# Altium footprint library PartsDatabaseV16.1.PcbLib: 145 footprints (part 1 of 10)
Each footprint in its own frame and in the unit in brackets; x right, y up, seen from the top. Pads: shape width x height; smd on the part's side, far side on the other; paste and mask are expansions set on the pad; w line width, h text height; cw(c..) or ccw(c..) is an arc to the next point about the centre after c.
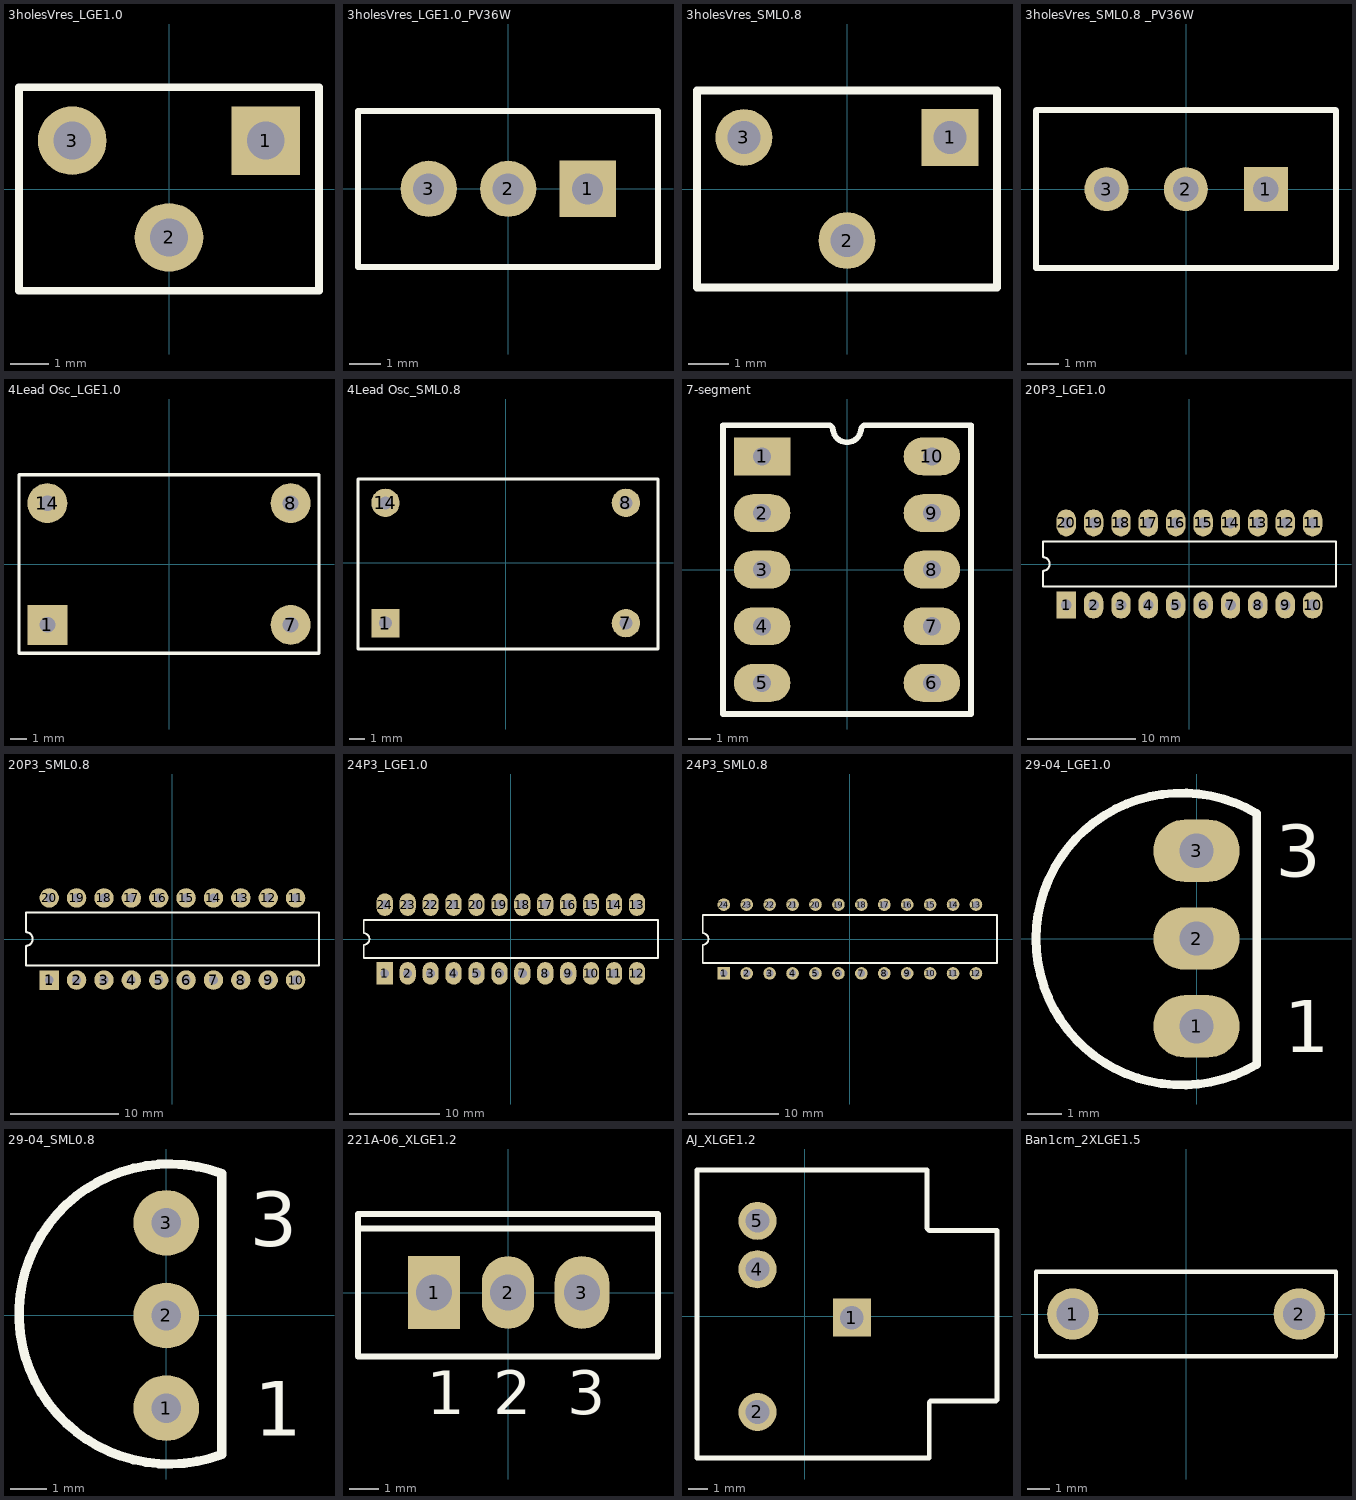
[diagram p0: the footprints below, top view; thin cyan lines are the x and y axes]

## 3holesVres_LGE1.0 [mm] "Variable Resistor, Thru-Hole; 3 Leads"
pads (3):
  rect 1.8x1.8 hole 0.991: 1(2.54,1.27)
  round 1.8 hole 0.991: 2(0,-1.27) 3(-2.54,1.27)
Top Overlay:
  lines w0.2: -3.937,-2.667 -3.937,2.667 3.937,2.667 3.937,-2.667 -3.937,-2.667

## 3holesVres_LGE1.0_PV36W [mm] "Variable Resistor, Thru-Hole; 3 Leads"
pads (3):
  rect 1.8x1.8 hole 0.991: 1(2.54,0)
  round 1.8 hole 0.991: 2(0,0) 3(-2.54,0)
Top Overlay:
  lines w0.2: -4.801,-2.502 -4.801,2.476 ; -4.763,-2.502 4.763,-2.502 ; -4.763,2.489 4.763,2.489 ; 4.788,-2.489 4.788,2.489
3D body "P-trim.step": height 11.3, standoff -1.5, extent -4.801,-2.538 4.799,2.462

## 3holesVres_SML0.8 [mm] "Variable Resistor, Thru-Hole; 3 Leads"
pads (3):
  rect 1.4x1.4 hole 0.813: 1(2.54,1.27)
  round 1.4 hole 0.813: 2(0,-1.27) 3(-2.54,1.27)
Top Overlay:
  lines w0.2: -3.696,-2.426 3.696,-2.426 3.696,2.426 -3.696,2.426 -3.696,-2.426

## 3holesVres_SML0.8 _PV36W [mm] "Variable Resistor, Thru-Hole; 3 Leads"
pads (3):
  rect 1.4x1.4 hole 0.813: 1(2.54,0)
  round 1.4 hole 0.813: 2(-0.013,0) 3(-2.54,0)
Top Overlay:
  lines w0.2: 4.775,-2.515 -4.775,-2.515 -4.788,-2.502 -4.788,2.502 -4.763,2.527 4.75,2.527 4.775,2.502 4.775,-2.489
3D body "P-trim.step": height 11.3, standoff -1.5, extent -4.825,-2.449 4.775,2.551

## 4Lead Osc_LGE1.0 [mm] "Double-Pole, Single-Throw Switch; 4 Leads"
pads (4):
  rect 2.5x2.5 hole 0.991: 1(-7.62,-3.81)
  round 2.5 hole 0.991: 7(7.62,-3.81) 8(7.62,3.81) 14(-7.62,3.81)
Top Overlay:
  lines w0.2: -9.398,-5.588 -9.398,5.588 9.398,5.588 9.398,-5.588 -9.398,-5.588

## 4Lead Osc_SML0.8 [mm] "Double-Pole, Single-Throw Switch; 4 Leads"
pads (4):
  rect 1.8x1.8 hole 0.813: 1(-7.62,-3.81)
  round 1.8 hole 0.813: 7(7.62,-3.81) 8(7.62,3.81) 14(-7.62,3.81)
Top Overlay:
  lines w0.2: -9.36,-5.461 -9.36,5.334 9.652,5.334 9.652,-5.461 -9.36,-5.461

## 7-segment [mm]
pads (10):
  rect 2.54x1.7 hole 0.813: 1(-3.81,5.08)
  oval 2.54x1.7 hole 0.813: 2(-3.81,2.54) 3(-3.81,0) 4(-3.81,-2.54) 5(-3.81,-5.08) 6(3.81,-5.08) 7(3.81,-2.54) 8(3.81,0) 9(3.81,2.54) 10(3.81,5.08)
Top Overlay:
  lines w0.254: -5.563,-6.477 5.563,-6.477 5.563,6.477 0.762,6.477 0.635,6.35 cw(c0,6.35) -0.635,6.35 -0.762,6.477 -5.563,6.477 -5.563,-6.477
3D body "User Library-FYS-3912.STEP": height 0, standoff 0, extent -1268.857,-1267.333 -1268.857,-1267.333
3D body "User Library-FYS-3912.STEP": height 0, standoff 0, extent -1269.517,-1264.59 -1269.517,-1264.59
3D body "User Library-FYS-3912.STEP": height 0, standoff 0, extent -1269.441,-1275.867 -1269.441,-1275.867
3D body "7seg_2.step": height 7, standoff -4, extent -4.949,-6.525 5.051,6.475

## 20P3_LGE1.0 [mm] "DIP; 20 Leads; Row Spacing 7.62 mm; Pitch 2.54 mm"
height 5.33
pads (20):
  rect 1.8x2.5 hole 0.991: 1(-11.43,-3.81)
  oval 1.8x2.5 hole 0.991: 2(-8.89,-3.81) 3(-6.35,-3.81) 4(-3.81,-3.81) 5(-1.27,-3.81) 6(1.27,-3.81) 7(3.81,-3.81) 8(6.35,-3.81) 9(8.89,-3.81) 10(11.43,-3.81) 11(11.43,3.81) 12(8.89,3.81) 13(6.35,3.81) 14(3.81,3.81) 15(1.27,3.81) 16(-1.27,3.81) 17(-3.81,3.81) 18(-6.35,3.81) 19(-8.89,3.81) 20(-11.43,3.81)
Top Overlay:
  lines w0.2: -13.6,-2.095 -13.6,-0.635 ccw(c-13.6,0) -13.6,0.635 -13.6,2.095 13.6,2.095 13.6,-2.095 -13.6,-2.095
3D body "DIP20.STEP": height 4.62, standoff -3.76, extent -13.31,-3.986 13.23,3.834

## 20P3_SML0.8 [mm] "DIP; 20 Leads; Row Spacing 7.62 mm; Pitch 2.54 mm"
height 5.33
pads (20):
  rect 1.8x1.8 hole 0.813: 1(-11.43,-3.81)
  round 1.8 hole 0.813: 2(-8.89,-3.81) 3(-6.35,-3.81) 4(-3.81,-3.81) 5(-1.27,-3.81) 6(1.27,-3.81) 7(3.81,-3.81) 8(6.35,-3.81) 9(8.89,-3.81) 10(11.43,-3.81) 11(11.43,3.81) 12(8.89,3.81) 13(6.35,3.81) 14(3.81,3.81) 15(1.27,3.81) 16(-1.27,3.81) 17(-3.81,3.81) 18(-6.35,3.81) 19(-8.89,3.81) 20(-11.43,3.81)
Top Overlay:
  lines w0.2: -13.6,-2.451 -13.6,-0.635 ccw(c-13.6,0) -13.6,0.635 -13.6,2.451 13.6,2.451 13.6,-2.451 -13.6,-2.451
3D body "DIP20.STEP": height 4.57, standoff -3.81, extent -13.284,-3.91 13.256,3.91

## 24P3_LGE1.0 [mm] "DIP; 24 Leads; Row Spacing 7.62 mm; Pitch 2.54 mm"
height 5.08
pads (24):
  rect 1.8x2.5 hole 0.991: 1(-13.97,-3.81)
  oval 1.8x2.5 hole 0.991: 2(-11.43,-3.81) 3(-8.89,-3.81) 4(-6.35,-3.81) 5(-3.81,-3.81) 6(-1.27,-3.81) 7(1.27,-3.81) 8(3.81,-3.81) 9(6.35,-3.81) 10(8.89,-3.81) 11(11.43,-3.81) 12(13.97,-3.81) 13(13.97,3.81) 14(11.43,3.81) 15(8.89,3.81) 16(6.35,3.81) 17(3.81,3.81) 18(1.27,3.81) 19(-1.27,3.81) 20(-3.81,3.81) 21(-6.35,3.81) 22(-8.89,3.81) 23(-11.43,3.81) 24(-13.97,3.81)
Top Overlay:
  lines w0.2: -16.3,-2.095 -16.3,-0.635 ccw(c-16.3,0) -16.3,0.635 -16.3,2.095 16.3,2.095 16.3,-2.095 -16.3,-2.095
3D body "DIP24.step": height 5.08, standoff -2.49, extent -16.054,-3.986 16.206,3.884

## 24P3_SML0.8 [mm] "DIP; 24 Leads; Row Spacing 7.62 mm; Pitch 2.54 mm"
height 5.08
pads (24):
  rect 1.4x1.4 hole 0.813: 1(-13.97,-3.81)
  round 1.4 hole 0.813: 2(-11.43,-3.81) 3(-8.89,-3.81) 4(-6.35,-3.81) 5(-3.81,-3.81) 6(-1.27,-3.81) 7(1.27,-3.81) 8(3.81,-3.81) 9(6.35,-3.81) 10(8.89,-3.81) 11(11.43,-3.81) 12(13.97,-3.81) 13(13.97,3.81) 14(11.43,3.81) 15(8.89,3.81) 16(6.35,3.81) 17(3.81,3.81) 18(1.27,3.81) 19(-1.27,3.81) 20(-3.81,3.81) 21(-6.35,3.81) 22(-8.89,3.81) 23(-11.43,3.81) 24(-13.97,3.81)
Top Overlay:
  lines w0.2: -16.3,-2.654 16.3,-2.654 16.3,2.65 -16.3,2.65 -16.3,0.635 cw(c-16.3,0) -16.3,-0.635 -16.3,-2.654
3D body "DIP24.step": height 5.08, standoff -2.49, extent -16.104,-4.062 16.156,3.808

## 29-04_LGE1.0 [mm] "TO, Flat Index; 3 In-Line, Axial Leads; Body Dia. 4.8mm; Leads 0.48 x 0.5 mm (max)"
height 5.33
pads (3):
  oval 2.5x1.8 hole 0.991: 1(0,-2.54) 2(0,0) 3(0,2.54)
Top Overlay:
  lines w0.254: 1.725,-3.653 cw(c-0.419,-0.013) 1.736,3.622 ; 1.74,-3.645 1.74,3.594
  text "1" at 2.536,-3.29 h1.5
  text "3" at 2.286,1.79 h1.5
3D body "TO92.step": height 6.61, standoff -4.69, extent -2.575,-2.714 1.525,2.816

## 29-04_SML0.8 [mm] "TO, Flat Index; 3 In-Line, Axial Leads; Body Dia. 4.8mm; Leads 0.48 x 0.5 mm (max)"
height 5.33
pads (3):
  round 1.8 hole 0.813: 1(0,-2.54) 2(0,0) 3(0,2.54)
Top Overlay:
  lines w0.254: 1.522,3.891 ccw(c0.075,0.04) 1.524,-3.81 1.524,3.85
  text "3" at 2.286,1.905 h1.5
  text "1" at 2.413,-3.302 h1.5
3D body "TO92.step": height 6.61, standoff -4.69, extent -2.551,-2.74 1.549,2.791

## 221A-06_XLGE1.2 [mm] "TO, Thru-Hole, Vertical, Heatsink Mounted; 3 In-Line Leads; Pitch 2.54 mm"
height 19.7
pads (3):
  rect 1.8x2.5 hole 1.245: 1(-2.54,0)
  oval 1.8x2.5 hole 1.245: 2(0,0)
  oval 1.88x2.5 hole 1.245: 3(2.54,0)
Top Overlay:
  lines w0.2: -5.15,2.2 5.15,2.2 ; -5.15,-2.2 -5.15,2.7 5.15,2.7 5.15,-2.2 -5.15,-2.2
  text "3" at 2.04,-4.175 h1.5
  text "2" at -0.5,-4.175 h1.5
  text "1" at -2.79,-4.175 h1.5
3D body "TO-220AB.STEP": height 19.86, standoff -4, extent -5.335,-2.235 5.335,2.595

## AJ_XLGE1.2 [mil] "Audio Jack, PCB Mount"
pads (4):
  rect 78.74x78.74 hole 49: 1(97.5,-2.5)
  round 78.74 hole 49: 2(-97.5,-197.5) 4(-97.5,97.5) 5(-97.5,197.5)
Top Overlay:
  lines w10: -222.5,-292.5 257.5,-292.5 257.5,-177.5 260.33,-174.67 307.5,-174.67 395.33,-174.67 397.5,-172.5 397.5,177.5 257.5,177.5 252.5,182.5 252.5,302.5 -222.5,302.5 -222.5,-292.5

## Ban1cm_2XLGE1.5 [mm] "Banana plug fem, Thru-Hole; 2 Leads"
pads (2):
  round 2.3 hole 1.448: 1(-5.08,0) 2(5.08,0)
Top Overlay:
  lines w0.2: -6.731,-1.905 -6.731,1.905 6.731,1.905 6.731,-1.905 -6.731,-1.905